# Altium footprint library baterries_and_accus.PcbLib: 26 footprints (part 2 of 2)
Each footprint in its own frame and in the unit in brackets; x right, y up, seen from the top. Pads: shape width x height; smd on the part's side, far side on the other; paste and mask are expansions set on the pad; w line width, h text height; cw(c..) or ccw(c..) is an arc to the next point about the centre after c.
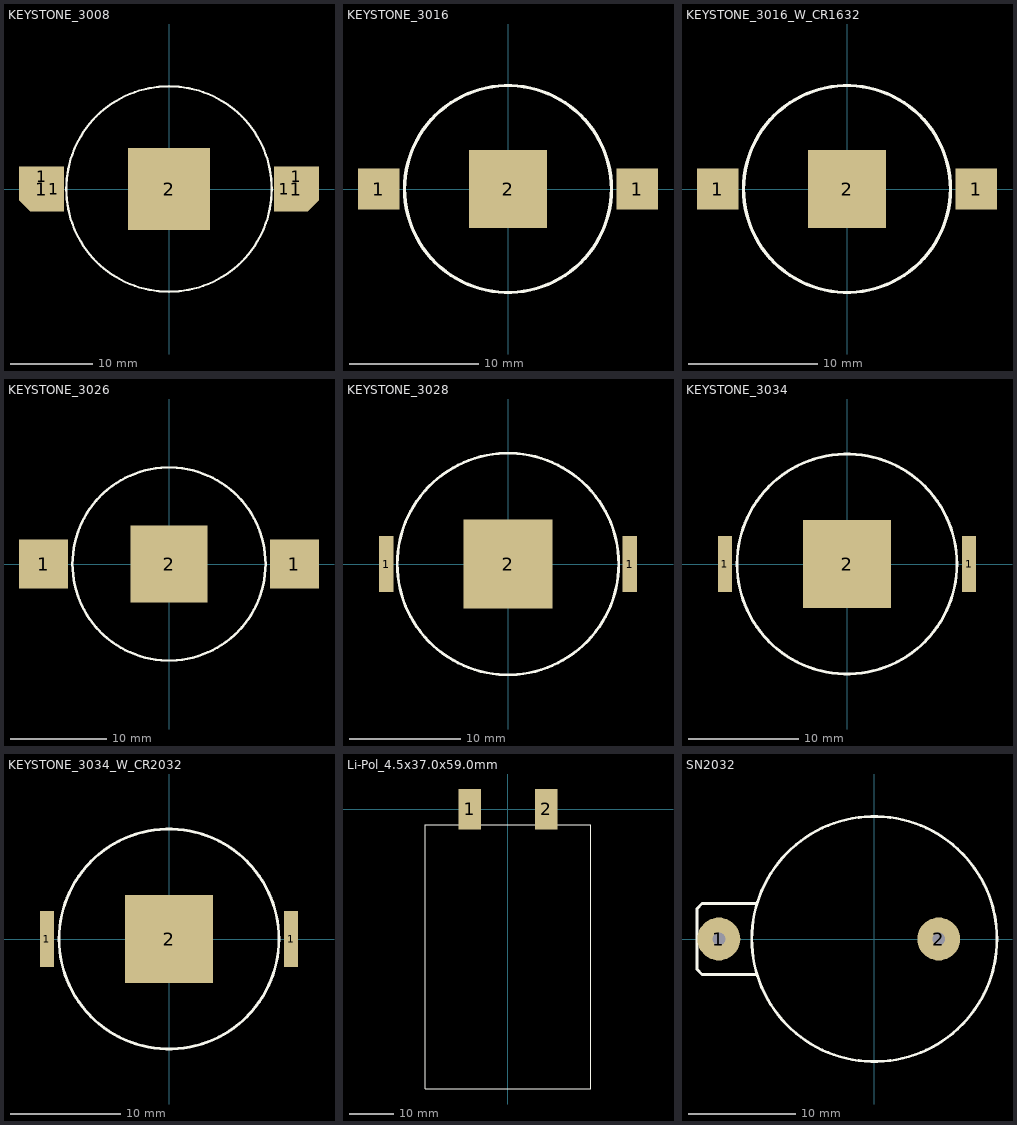
[diagram p1: the footprints below, top view; thin cyan lines are the x and y axes]

## KEYSTONE_3008 [mm] "CR2450 Battery Surface Mount Compact Contact"
height 5.8
pads (7):
  oct 5.5x5.5 smd: 1(-15.5,0) 1(15.5,0)
  rect 5.5x2.5 smd: 1(-15.5,1.5) 1(15.5,1.5)
  rect 2.5x5.5 smd: 1(-14,0) 1(14,0)
  rect 10x10 smd: 2(0,0)
Top Overlay:
  circle w0.254: c0,0 r12.5
3D body "User Library-Keystone 3008 Battery Holder.step": height 5.84, standoff 0, extent -17.78,-10.17 17.78,12.827

## KEYSTONE_3016 [mm] "CR1612, 1620, 1632 Battery Surface Mount Retainer"
pads (3):
  rect 3.2x3.2 smd: 1(-10,0) 1(10,0)
  rect 6x6 smd: 2(0,0)
Top Overlay:
  circle w0.254: c0,0 r8
3D body "User Library-keystone-PN3016.step": height 3.95, standoff -0.01, extent -11.598,-6.339 11.619,8.739

## KEYSTONE_3016_W_CR1632 [mm] "CR1612, 1620, 1632 Battery Surface Mount Retainer"
pads (3):
  rect 3.2x3.2 smd: 1(-10,0) 1(10,0)
  rect 6x6 smd: 2(0,0)
Top Overlay:
  circle w0.254: c0,0 r8
3D body "User Library-001085 cr-1632 batt.step": height 3.2, standoff 0, extent -8,-8 8,8
3D body "User Library-keystone-PN3016.step": height 3.95, standoff -0.01, extent -11.598,-6.339 11.619,8.739

## KEYSTONE_3026 [mm] "CR2016 Battery Surface Mount Retainer"
pads (3):
  rect 5.08x5.08 smd: 1(-13,0) 1(13,0)
  rect 8x8 smd: 2(0,0)
Top Overlay:
  circle w0.254: c0,0 r10
3D body "keystone-PN3026.STEP": height 2.15, standoff -0.01, extent -15.38,-10.508 15.38,9.355

## KEYSTONE_3028 [mm] "CR2012 Battery Surface Mount Retainer"
pads (3):
  rect 1.3x5.08 smd: 1(-11,0) 1(11,0)
  rect 8x8 smd: 2(0,0)
Top Overlay:
  circle w0.254: c0,0 r10
3D body "keystone-PN3028.STEP": height 1.75, standoff 0.05, extent -11.57,-7.957 11.57,8

## KEYSTONE_3034 [mm] "CR2020, CR2025, CR2032 Battery Surface Mount Retainer"
pads (3):
  rect 1.27x5.08 smd: 1(-11.1,0) 1(11.1,0)
  rect 8x8 smd: 2(0,0)
Top Overlay:
  circle w0.254: c0,0 r10
3D body "keystone-PN3034.STEP": height 4.05, standoff -0.01, extent -11.621,-7.779 11.621,8.7

## KEYSTONE_3034_W_CR2032 [mm] "CR2020, CR2025, CR2032 Battery Surface Mount Retainer"
pads (3):
  rect 1.27x5.08 smd: 1(-11.1,0) 1(11.1,0)
  rect 8x8 smd: 2(0,0)
Top Overlay:
  circle w0.254: c0,0 r10
3D body "CircuitWorks-BATT CR2032.step": height 3.3, standoff 0.1, extent -10,-10 10,10
3D body "keystone-PN3034.STEP": height 4.05, standoff -0.01, extent -11.621,-7.779 11.621,8.7

## Li-Pol_4.5x37.0x59.0mm [mm] "e.g. SONY US453759 1260mAh Li-POL 3,7V"
height 4.5
pads (2):
  rect 5x9 smd: 1(-8.5,0) 2(8.5,0)
Top Overlay:
  lines w0.2: -18.5,-62.5 -18.5,-3.5 18.5,-3.5 18.5,-62.5 -18.5,-62.5
3D body: height 4.5, standoff 0, extent -18.5,-62.5 18.5,-3.5

## SN2032 [mm]
pads (2):
  round 4 hole 1.2: 1(-14.5,0) 2(6,0)
Top Overlay:
  circle w0.254: c0,0 r11.43
  lines w0.254: -10.947,-3.302 -16.053,-3.302 -16.535,-2.819 -16.535,2.819 -16.053,3.302 -10.947,3.302
3D body "User Library-CR 2032 (Battery Holder).step": height 7.05, standoff -3.5, extent -17.925,-11.275 10.775,11.475

## XP01101ES [mm]
height 5.5
3D body: height 5.5, standoff 0, extent 0,0 30.5,12